# Altium footprint library ref-packages.PCBLIB: 1543 footprints (part 82 of 103) (continued)
## SQFP-S-40X40-512 [mm] (continued)
  rect 1.6x0.17 smd: 129(20.6,-19.05) 130(20.6,-18.75) 131(20.6,-18.45) 132(20.6,-18.15) 133(20.6,-17.85) 134(20.6,-17.55) 135(20.6,-17.25) 136(20.6,-16.95) 137(20.6,-16.65) 138(20.6,-16.35) 139(20.6,-16.05) 140(20.6,-15.75) 141(20.6,-15.45) 142(20.6,-15.15) 143(20.6,-14.85) 144(20.6,-14.55) 145(20.6,-14.25) 146(20.6,-13.95) 147(20.6,-13.65) 148(20.6,-13.35) 149(20.6,-13.05) 150(20.6,-12.75) 151(20.6,-12.45) 152(20.6,-12.15) 153(20.6,-11.85) 154(20.6,-11.55) 155(20.6,-11.25) 156(20.6,-10.95) 157(20.6,-10.65) 158(20.6,-10.35) 159(20.6,-10.05) 160(20.6,-9.75) 161(20.6,-9.45) 162(20.6,-9.15) 163(20.6,-8.85) 164(20.6,-8.55) 165(20.6,-8.25) 166(20.6,-7.95) 167(20.6,-7.65) 168(20.6,-7.35) 169(20.6,-7.05) 170(20.6,-6.75) 171(20.6,-6.45) 172(20.6,-6.15) 173(20.6,-5.85) 174(20.6,-5.55) 175(20.6,-5.25) 176(20.6,-4.95) 177(20.6,-4.65) 178(20.6,-4.35) 179(20.6,-4.05) 180(20.6,-3.75) 181(20.6,-3.45) 182(20.6,-3.15) 183(20.6,-2.85) 184(20.6,-2.55) 185(20.6,-2.25) 186(20.6,-1.95) 187(20.6,-1.65) 188(20.6,-1.35) 189(20.6,-1.05) 190(20.6,-0.75) 191(20.6,-0.45) 192(20.6,-0.15) 193(20.6,0.15) 194(20.6,0.45) 195(20.6,0.75) 196(20.6,1.05) 197(20.6,1.35) 198(20.6,1.65) 199(20.6,1.95) 200(20.6,2.25) 201(20.6,2.55) 202(20.6,2.85) 203(20.6,3.15) 204(20.6,3.45) 205(20.6,3.75) 206(20.6,4.05) 207(20.6,4.35) 208(20.6,4.65) 209(20.6,4.95) 210(20.6,5.25) 211(20.6,5.55) 212(20.6,5.85) 213(20.6,6.15) 214(20.6,6.45) 215(20.6,6.75) 216(20.6,7.05) 217(20.6,7.35) 218(20.6,7.65) 219(20.6,7.95) 220(20.6,8.25) 221(20.6,8.55) 222(20.6,8.85) 223(20.6,9.15) 224(20.6,9.45) 225(20.6,9.75) 226(20.6,10.05) 227(20.6,10.35) 228(20.6,10.65) 229(20.6,10.95) 230(20.6,11.25) 231(20.6,11.55) 232(20.6,11.85) 233(20.6,12.15) 234(20.6,12.45) 235(20.6,12.75) 236(20.6,13.05) 237(20.6,13.35) 238(20.6,13.65) 239(20.6,13.95) 240(20.6,14.25) 241(20.6,14.55) 242(20.6,14.85) 243(20.6,15.15) 244(20.6,15.45) 245(20.6,15.75) 246(20.6,16.05) 247(20.6,16.35) 248(20.6,16.65) 249(20.6,16.95) 250(20.6,17.25) 251(20.6,17.55) 252(20.6,17.85) 253(20.6,18.15) 254(20.6,18.45) 255(20.6,18.75) 256(20.6,19.05) 385(-20.6,19.05) 386(-20.6,18.75) 387(-20.6,18.45) 388(-20.6,18.15) 389(-20.6,17.85) 390(-20.6,17.55) 391(-20.6,17.25) 392(-20.6,16.95) 393(-20.6,16.65) 394(-20.6,16.35) 395(-20.6,16.05) 396(-20.6,15.75) 397(-20.6,15.45) 398(-20.6,15.15) 399(-20.6,14.85) 400(-20.6,14.55) 401(-20.6,14.25) 402(-20.6,13.95) 403(-20.6,13.65) 404(-20.6,13.35) 405(-20.6,13.05) 406(-20.6,12.75) 407(-20.6,12.45) 408(-20.6,12.15) 409(-20.6,11.85) 410(-20.6,11.55) 411(-20.6,11.25) 412(-20.6,10.95) 413(-20.6,10.65) 414(-20.6,10.35) 415(-20.6,10.05) 416(-20.6,9.75) 417(-20.6,9.45) 418(-20.6,9.15) 419(-20.6,8.85) 420(-20.6,8.55) 421(-20.6,8.25) 422(-20.6,7.95) 423(-20.6,7.65) 424(-20.6,7.35) 425(-20.6,7.05) 426(-20.6,6.75) 427(-20.6,6.45) 428(-20.6,6.15) 429(-20.6,5.85) 430(-20.6,5.55) 431(-20.6,5.25) 432(-20.6,4.95) 433(-20.6,4.65) 434(-20.6,4.35) 435(-20.6,4.05) 436(-20.6,3.75) 437(-20.6,3.45) 438(-20.6,3.15) 439(-20.6,2.85) 440(-20.6,2.55) 441(-20.6,2.25) 442(-20.6,1.95) 443(-20.6,1.65) 444(-20.6,1.35) 445(-20.6,1.05) 446(-20.6,0.75) 447(-20.6,0.45) 448(-20.6,0.15) 449(-20.6,-0.15) 450(-20.6,-0.45) 451(-20.6,-0.75) 452(-20.6,-1.05) 453(-20.6,-1.35) 454(-20.6,-1.65) 455(-20.6,-1.95) 456(-20.6,-2.25) 457(-20.6,-2.55) 458(-20.6,-2.85) 459(-20.6,-3.15) 460(-20.6,-3.45) 461(-20.6,-3.75) 462(-20.6,-4.05) 463(-20.6,-4.35) 464(-20.6,-4.65) 465(-20.6,-4.95) 466(-20.6,-5.25) 467(-20.6,-5.55) 468(-20.6,-5.85) 469(-20.6,-6.15) 470(-20.6,-6.45) 471(-20.6,-6.75) 472(-20.6,-7.05) 473(-20.6,-7.35) 474(-20.6,-7.65) 475(-20.6,-7.95) 476(-20.6,-8.25) 477(-20.6,-8.55) 478(-20.6,-8.85) 479(-20.6,-9.15) 480(-20.6,-9.45) 481(-20.6,-9.75) 482(-20.6,-10.05) 483(-20.6,-10.35) 484(-20.6,-10.65) 485(-20.6,-10.95) 486(-20.6,-11.25) 487(-20.6,-11.55) 488(-20.6,-11.85) 489(-20.6,-12.15) 490(-20.6,-12.45) 491(-20.6,-12.75) 492(-20.6,-13.05) 493(-20.6,-13.35) 494(-20.6,-13.65) 495(-20.6,-13.95) 496(-20.6,-14.25) 497(-20.6,-14.55) 498(-20.6,-14.85) 499(-20.6,-15.15) 500(-20.6,-15.45) 501(-20.6,-15.75) 502(-20.6,-16.05) 503(-20.6,-16.35) 504(-20.6,-16.65) 505(-20.6,-16.95) 506(-20.6,-17.25) 507(-20.6,-17.55) 508(-20.6,-17.85) 509(-20.6,-18.15) 510(-20.6,-18.45) 511(-20.6,-18.75) 512(-20.6,-19.05)
Top Overlay:
  circle w0.254: c-18.2,-18.2 r0.75
  lines w0.203: -19.77,-19.76 19.76,-19.76 19.76,19.76 -19.77,19.76 -19.77,-19.76
Mechanical 16:
  drawing of 516 lines, arcs and shapes, not listed
Mechanical 27:
  lines w0.2: -21.9,-21.9 -21.9,21.9 21.9,21.9 21.9,-21.9 -21.9,-21.9

## SQFP-S-40X40-520 [mm]
pads (520):
  rect 0.17x1.6 smd: 1(-19.35,-20.6) 2(-19.05,-20.6) 3(-18.75,-20.6) 4(-18.45,-20.6) 5(-18.15,-20.6) 6(-17.85,-20.6) 7(-17.55,-20.6) 8(-17.25,-20.6) 9(-16.95,-20.6) 10(-16.65,-20.6) 11(-16.35,-20.6) 12(-16.05,-20.6) 13(-15.75,-20.6) 14(-15.45,-20.6) 15(-15.15,-20.6) 16(-14.85,-20.6) 17(-14.55,-20.6) 18(-14.25,-20.6) 19(-13.95,-20.6) 20(-13.65,-20.6) 21(-13.35,-20.6) 22(-13.05,-20.6) 23(-12.75,-20.6) 24(-12.45,-20.6) 25(-12.15,-20.6) 26(-11.85,-20.6) 27(-11.55,-20.6) 28(-11.25,-20.6) 29(-10.95,-20.6) 30(-10.65,-20.6) 31(-10.35,-20.6) 32(-10.05,-20.6) 33(-9.75,-20.6) 34(-9.45,-20.6) 35(-9.15,-20.6) 36(-8.85,-20.6) 37(-8.55,-20.6) 38(-8.25,-20.6) 39(-7.95,-20.6) 40(-7.65,-20.6) 41(-7.35,-20.6) 42(-7.05,-20.6) 43(-6.75,-20.6) 44(-6.45,-20.6) 45(-6.15,-20.6) 46(-5.85,-20.6) 47(-5.55,-20.6) 48(-5.25,-20.6) 49(-4.95,-20.6) 50(-4.65,-20.6) 51(-4.35,-20.6) 52(-4.05,-20.6) 53(-3.75,-20.6) 54(-3.45,-20.6) 55(-3.15,-20.6) 56(-2.85,-20.6) 57(-2.55,-20.6) 58(-2.25,-20.6) 59(-1.95,-20.6) 60(-1.65,-20.6) 61(-1.35,-20.6) 62(-1.05,-20.6) 63(-0.75,-20.6) 64(-0.45,-20.6) 65(-0.15,-20.6) 66(0.15,-20.6) 67(0.45,-20.6) 68(0.75,-20.6) 69(1.05,-20.6) 70(1.35,-20.6) 71(1.65,-20.6) 72(1.95,-20.6) 73(2.25,-20.6) 74(2.55,-20.6) 75(2.85,-20.6) 76(3.15,-20.6) 77(3.45,-20.6) 78(3.75,-20.6) 79(4.05,-20.6) 80(4.35,-20.6) 81(4.65,-20.6) 82(4.95,-20.6) 83(5.25,-20.6) 84(5.55,-20.6) 85(5.85,-20.6) 86(6.15,-20.6) 87(6.45,-20.6) 88(6.75,-20.6) 89(7.05,-20.6) 90(7.35,-20.6) 91(7.65,-20.6) 92(7.95,-20.6) 93(8.25,-20.6) 94(8.55,-20.6) 95(8.85,-20.6) 96(9.15,-20.6) 97(9.45,-20.6) 98(9.75,-20.6) 99(10.05,-20.6) 100(10.35,-20.6) 101(10.65,-20.6) 102(10.95,-20.6) 103(11.25,-20.6) 104(11.55,-20.6) 105(11.85,-20.6) 106(12.15,-20.6) 107(12.45,-20.6) 108(12.75,-20.6) 109(13.05,-20.6) 110(13.35,-20.6) 111(13.65,-20.6) 112(13.95,-20.6) 113(14.25,-20.6) 114(14.55,-20.6) 115(14.85,-20.6) 116(15.15,-20.6) 117(15.45,-20.6) 118(15.75,-20.6) 119(16.05,-20.6) 120(16.35,-20.6) 121(16.65,-20.6) 122(16.95,-20.6) 123(17.25,-20.6) 124(17.55,-20.6) 125(17.85,-20.6) 126(18.15,-20.6) 127(18.45,-20.6) 128(18.75,-20.6) 129(19.05,-20.6) 130(19.35,-20.6) 261(19.35,20.6) 262(19.05,20.6) 263(18.75,20.6) 264(18.45,20.6) 265(18.15,20.6) 266(17.85,20.6) 267(17.55,20.6) 268(17.25,20.6) 269(16.95,20.6) 270(16.65,20.6) 271(16.35,20.6) 272(16.05,20.6) 273(15.75,20.6) 274(15.45,20.6) 275(15.15,20.6) 276(14.85,20.6) 277(14.55,20.6) 278(14.25,20.6) 279(13.95,20.6) 280(13.65,20.6) 281(13.35,20.6) 282(13.05,20.6) 283(12.75,20.6) 284(12.45,20.6) 285(12.15,20.6) 286(11.85,20.6) 287(11.55,20.6) 288(11.25,20.6) 289(10.95,20.6) 290(10.65,20.6) 291(10.35,20.6) 292(10.05,20.6) 293(9.75,20.6) 294(9.45,20.6) 295(9.15,20.6) 296(8.85,20.6) 297(8.55,20.6) 298(8.25,20.6) 299(7.95,20.6) 300(7.65,20.6) 301(7.35,20.6) 302(7.05,20.6) 303(6.75,20.6) 304(6.45,20.6) 305(6.15,20.6) 306(5.85,20.6) 307(5.55,20.6) 308(5.25,20.6) 309(4.95,20.6) 310(4.65,20.6) 311(4.35,20.6) 312(4.05,20.6) 313(3.75,20.6) 314(3.45,20.6) 315(3.15,20.6) 316(2.85,20.6) 317(2.55,20.6) 318(2.25,20.6) 319(1.95,20.6) 320(1.65,20.6) 321(1.35,20.6) 322(1.05,20.6) 323(0.75,20.6) 324(0.45,20.6) 325(0.15,20.6) 326(-0.15,20.6) 327(-0.45,20.6) 328(-0.75,20.6) 329(-1.05,20.6) 330(-1.35,20.6) 331(-1.65,20.6) 332(-1.95,20.6) 333(-2.25,20.6) 334(-2.55,20.6) 335(-2.85,20.6) 336(-3.15,20.6) 337(-3.45,20.6) 338(-3.75,20.6) 339(-4.05,20.6) 340(-4.35,20.6) 341(-4.65,20.6) 342(-4.95,20.6) 343(-5.25,20.6) 344(-5.55,20.6) 345(-5.85,20.6) 346(-6.15,20.6) 347(-6.45,20.6) 348(-6.75,20.6) 349(-7.05,20.6) 350(-7.35,20.6) 351(-7.65,20.6) 352(-7.95,20.6) 353(-8.25,20.6) 354(-8.55,20.6) 355(-8.85,20.6) 356(-9.15,20.6) 357(-9.45,20.6) 358(-9.75,20.6) 359(-10.05,20.6) 360(-10.35,20.6) 361(-10.65,20.6) 362(-10.95,20.6) 363(-11.25,20.6) 364(-11.55,20.6) 365(-11.85,20.6) 366(-12.15,20.6) 367(-12.45,20.6) 368(-12.75,20.6) 369(-13.05,20.6) 370(-13.35,20.6) 371(-13.65,20.6) 372(-13.95,20.6) 373(-14.25,20.6) 374(-14.55,20.6) 375(-14.85,20.6) 376(-15.15,20.6) 377(-15.45,20.6) 378(-15.75,20.6) 379(-16.05,20.6) 380(-16.35,20.6) 381(-16.65,20.6) 382(-16.95,20.6) 383(-17.25,20.6) 384(-17.55,20.6) 385(-17.85,20.6) 386(-18.15,20.6) 387(-18.45,20.6) 388(-18.75,20.6) 389(-19.05,20.6) 390(-19.35,20.6)
  rect 1.6x0.17 smd: 131(20.6,-19.35) 132(20.6,-19.05) 133(20.6,-18.75) 134(20.6,-18.45) 135(20.6,-18.15) 136(20.6,-17.85) 137(20.6,-17.55) 138(20.6,-17.25) 139(20.6,-16.95) 140(20.6,-16.65) 141(20.6,-16.35) 142(20.6,-16.05) 143(20.6,-15.75) 144(20.6,-15.45) 145(20.6,-15.15) 146(20.6,-14.85) 147(20.6,-14.55) 148(20.6,-14.25) 149(20.6,-13.95) 150(20.6,-13.65) 151(20.6,-13.35) 152(20.6,-13.05) 153(20.6,-12.75) 154(20.6,-12.45) 155(20.6,-12.15) 156(20.6,-11.85) 157(20.6,-11.55) 158(20.6,-11.25) 159(20.6,-10.95) 160(20.6,-10.65) 161(20.6,-10.35) 162(20.6,-10.05) 163(20.6,-9.75) 164(20.6,-9.45) 165(20.6,-9.15) 166(20.6,-8.85) 167(20.6,-8.55) 168(20.6,-8.25) 169(20.6,-7.95) 170(20.6,-7.65) 171(20.6,-7.35) 172(20.6,-7.05) 173(20.6,-6.75) 174(20.6,-6.45) 175(20.6,-6.15) 176(20.6,-5.85) 177(20.6,-5.55) 178(20.6,-5.25) 179(20.6,-4.95) 180(20.6,-4.65) 181(20.6,-4.35) 182(20.6,-4.05) 183(20.6,-3.75) 184(20.6,-3.45) 185(20.6,-3.15) 186(20.6,-2.85) 187(20.6,-2.55) 188(20.6,-2.25) 189(20.6,-1.95) 190(20.6,-1.65) 191(20.6,-1.35) 192(20.6,-1.05) 193(20.6,-0.75) 194(20.6,-0.45) 195(20.6,-0.15) 196(20.6,0.15) 197(20.6,0.45) 198(20.6,0.75) 199(20.6,1.05) 200(20.6,1.35) 201(20.6,1.65) 202(20.6,1.95) 203(20.6,2.25) 204(20.6,2.55) 205(20.6,2.85) 206(20.6,3.15) 207(20.6,3.45) 208(20.6,3.75) 209(20.6,4.05) 210(20.6,4.35) 211(20.6,4.65) 212(20.6,4.95) 213(20.6,5.25) 214(20.6,5.55) 215(20.6,5.85) 216(20.6,6.15) 217(20.6,6.45) 218(20.6,6.75) 219(20.6,7.05) 220(20.6,7.35) 221(20.6,7.65) 222(20.6,7.95) 223(20.6,8.25) 224(20.6,8.55) 225(20.6,8.85) 226(20.6,9.15) 227(20.6,9.45) 228(20.6,9.75) 229(20.6,10.05) 230(20.6,10.35) 231(20.6,10.65) 232(20.6,10.95) 233(20.6,11.25) 234(20.6,11.55) 235(20.6,11.85) 236(20.6,12.15) 237(20.6,12.45) 238(20.6,12.75) 239(20.6,13.05) 240(20.6,13.35) 241(20.6,13.65) 242(20.6,13.95) 243(20.6,14.25) 244(20.6,14.55) 245(20.6,14.85) 246(20.6,15.15) 247(20.6,15.45) 248(20.6,15.75) 249(20.6,16.05) 250(20.6,16.35) 251(20.6,16.65) 252(20.6,16.95) 253(20.6,17.25) 254(20.6,17.55) 255(20.6,17.85) 256(20.6,18.15) 257(20.6,18.45) 258(20.6,18.75) 259(20.6,19.05) 260(20.6,19.35) 391(-20.6,19.35) 392(-20.6,19.05) 393(-20.6,18.75) 394(-20.6,18.45) 395(-20.6,18.15) 396(-20.6,17.85) 397(-20.6,17.55) 398(-20.6,17.25) 399(-20.6,16.95) 400(-20.6,16.65) 401(-20.6,16.35) 402(-20.6,16.05) 403(-20.6,15.75) 404(-20.6,15.45) 405(-20.6,15.15) 406(-20.6,14.85) 407(-20.6,14.55) 408(-20.6,14.25) 409(-20.6,13.95) 410(-20.6,13.65) 411(-20.6,13.35) 412(-20.6,13.05) 413(-20.6,12.75) 414(-20.6,12.45) 415(-20.6,12.15) 416(-20.6,11.85) 417(-20.6,11.55) 418(-20.6,11.25) 419(-20.6,10.95) 420(-20.6,10.65) 421(-20.6,10.35) 422(-20.6,10.05) 423(-20.6,9.75) 424(-20.6,9.45) 425(-20.6,9.15) 426(-20.6,8.85) 427(-20.6,8.55) 428(-20.6,8.25) 429(-20.6,7.95) 430(-20.6,7.65) 431(-20.6,7.35) 432(-20.6,7.05) 433(-20.6,6.75) 434(-20.6,6.45) 435(-20.6,6.15) 436(-20.6,5.85) 437(-20.6,5.55) 438(-20.6,5.25) 439(-20.6,4.95) 440(-20.6,4.65) 441(-20.6,4.35) 442(-20.6,4.05) 443(-20.6,3.75) 444(-20.6,3.45) 445(-20.6,3.15) 446(-20.6,2.85) 447(-20.6,2.55) 448(-20.6,2.25) 449(-20.6,1.95) 450(-20.6,1.65) 451(-20.6,1.35) 452(-20.6,1.05) 453(-20.6,0.75) 454(-20.6,0.45) 455(-20.6,0.15) 456(-20.6,-0.15) 457(-20.6,-0.45) 458(-20.6,-0.75) 459(-20.6,-1.05) 460(-20.6,-1.35) 461(-20.6,-1.65) 462(-20.6,-1.95) 463(-20.6,-2.25) 464(-20.6,-2.55) 465(-20.6,-2.85) 466(-20.6,-3.15) 467(-20.6,-3.45) 468(-20.6,-3.75) 469(-20.6,-4.05) 470(-20.6,-4.35) 471(-20.6,-4.65) 472(-20.6,-4.95) 473(-20.6,-5.25) 474(-20.6,-5.55) 475(-20.6,-5.85) 476(-20.6,-6.15) 477(-20.6,-6.45) 478(-20.6,-6.75) 479(-20.6,-7.05) 480(-20.6,-7.35) 481(-20.6,-7.65) 482(-20.6,-7.95) 483(-20.6,-8.25) 484(-20.6,-8.55) 485(-20.6,-8.85) 486(-20.6,-9.15) 487(-20.6,-9.45) 488(-20.6,-9.75) 489(-20.6,-10.05) 490(-20.6,-10.35) 491(-20.6,-10.65) 492(-20.6,-10.95) 493(-20.6,-11.25) 494(-20.6,-11.55) 495(-20.6,-11.85) 496(-20.6,-12.15) 497(-20.6,-12.45) 498(-20.6,-12.75) 499(-20.6,-13.05) 500(-20.6,-13.35) 501(-20.6,-13.65) 502(-20.6,-13.95) 503(-20.6,-14.25) 504(-20.6,-14.55) 505(-20.6,-14.85) 506(-20.6,-15.15) 507(-20.6,-15.45) 508(-20.6,-15.75) 509(-20.6,-16.05) 510(-20.6,-16.35) 511(-20.6,-16.65) 512(-20.6,-16.95) 513(-20.6,-17.25) 514(-20.6,-17.55) 515(-20.6,-17.85) 516(-20.6,-18.15) 517(-20.6,-18.45) 518(-20.6,-18.75) 519(-20.6,-19.05) 520(-20.6,-19.35)
Top Overlay:
  circle w0.254: c-18.2,-18.2 r0.75
  lines w0.203: -19.77,-19.76 19.76,-19.76 19.76,19.76 -19.77,19.76 -19.77,-19.76
Mechanical 16:
  drawing of 524 lines, arcs and shapes, not listed
Mechanical 27:
  lines w0.2: -21.9,-21.9 -21.9,21.9 21.9,21.9 21.9,-21.9 -21.9,-21.9

## SQFP-S-44X44-336 [mil]
pads (336):
  rect 11.81x62.99 smd: 1(-816.93,-889.76) 2(-797.24,-889.76) 3(-777.56,-889.76) 4(-757.87,-889.76) 5(-738.19,-889.76) 6(-718.5,-889.76) 7(-698.82,-889.76) 8(-679.13,-889.76) 9(-659.45,-889.76) 10(-639.76,-889.76) 11(-620.08,-889.76) 12(-600.39,-889.76) 13(-580.71,-889.76) 14(-561.02,-889.76) 15(-541.34,-889.76) 16(-521.65,-889.76) 17(-501.97,-889.76) 18(-482.28,-889.76) 19(-462.6,-889.76) 20(-442.91,-889.76) 21(-423.23,-889.76) 22(-403.54,-889.76) 23(-383.86,-889.76) 24(-364.17,-889.76) 25(-344.49,-889.76) 26(-324.8,-889.76) 27(-305.12,-889.76) 28(-285.43,-889.76) 29(-265.75,-889.76) 30(-246.06,-889.76) 31(-226.38,-889.76) 32(-206.69,-889.76) 33(-187.01,-889.76) 34(-167.32,-889.76) 35(-147.64,-889.76) 36(-127.95,-889.76) 37(-108.27,-889.76) 38(-88.58,-889.76) 39(-68.9,-889.76) 40(-49.21,-889.76) 41(-29.53,-889.76) 42(-9.84,-889.76) 43(9.84,-889.76) 44(29.53,-889.76) 45(49.21,-889.76) 46(68.9,-889.76) 47(88.58,-889.76) 48(108.27,-889.76) 49(127.95,-889.76) 50(147.64,-889.76) 51(167.32,-889.76) 52(187.01,-889.76) 53(206.69,-889.76) 54(226.38,-889.76) 55(246.06,-889.76) 56(265.75,-889.76) 57(285.43,-889.76) 58(305.12,-889.76) 59(324.8,-889.76) 60(344.49,-889.76) 61(364.17,-889.76) 62(383.86,-889.76) 63(403.54,-889.76) 64(423.23,-889.76) 65(442.91,-889.76) 66(462.6,-889.76) 67(482.28,-889.76) 68(501.97,-889.76) 69(521.65,-889.76) 70(541.34,-889.76) 71(561.02,-889.76) 72(580.71,-889.76) 73(600.39,-889.76) 74(620.08,-889.76) 75(639.76,-889.76) 76(659.45,-889.76) 77(679.13,-889.76) 78(698.82,-889.76) 79(718.5,-889.76) 80(738.19,-889.76) 81(757.87,-889.76) 82(777.56,-889.76) 83(797.24,-889.76) 84(816.93,-889.76) 169(816.93,889.76) 170(797.24,889.76) 171(777.56,889.76) 172(757.87,889.76) 173(738.19,889.76) 174(718.5,889.76) 175(698.82,889.76) 176(679.13,889.76) 177(659.45,889.76) 178(639.76,889.76) 179(620.08,889.76) 180(600.39,889.76) 181(580.71,889.76) 182(561.02,889.76) 183(541.34,889.76) 184(521.65,889.76) 185(501.97,889.76) 186(482.28,889.76) 187(462.6,889.76) 188(442.91,889.76) 189(423.23,889.76) 190(403.54,889.76) 191(383.86,889.76) 192(364.17,889.76) 193(344.49,889.76) 194(324.8,889.76) 195(305.12,889.76) 196(285.43,889.76) 197(265.75,889.76) 198(246.06,889.76) 199(226.38,889.76) 200(206.69,889.76) 201(187.01,889.76) 202(167.32,889.76) 203(147.64,889.76) 204(127.95,889.76) 205(108.27,889.76) 206(88.58,889.76) 207(68.9,889.76) 208(49.21,889.76) 209(29.53,889.76) 210(9.84,889.76) 211(-9.84,889.76) 212(-29.53,889.76) 213(-49.21,889.76) 214(-68.9,889.76) 215(-88.58,889.76) 216(-108.27,889.76) 217(-127.95,889.76) 218(-147.64,889.76) 219(-167.32,889.76) 220(-187.01,889.76) 221(-206.69,889.76) 222(-226.38,889.76) 223(-246.06,889.76) 224(-265.75,889.76) 225(-285.43,889.76) 226(-305.12,889.76) 227(-324.8,889.76) 228(-344.49,889.76) 229(-364.17,889.76) 230(-383.86,889.76) 231(-403.54,889.76) 232(-423.23,889.76) 233(-442.91,889.76) 234(-462.6,889.76) 235(-482.28,889.76) 236(-501.97,889.76) 237(-521.65,889.76) 238(-541.34,889.76) 239(-561.02,889.76) 240(-580.71,889.76) 241(-600.39,889.76) 242(-620.08,889.76) 243(-639.76,889.76) 244(-659.45,889.76) 245(-679.13,889.76) 246(-698.82,889.76) 247(-718.5,889.76) 248(-738.19,889.76) 249(-757.87,889.76) 250(-777.56,889.76) 251(-797.24,889.76) 252(-816.93,889.76)
  rect 62.99x11.81 smd: 85(889.76,-816.93) 86(889.76,-797.24) 87(889.76,-777.56) 88(889.76,-757.87) 89(889.76,-738.19) 90(889.76,-718.5) 91(889.76,-698.82) 92(889.76,-679.13) 93(889.76,-659.45) 94(889.76,-639.76) 95(889.76,-620.08) 96(889.76,-600.39) 97(889.76,-580.71) 98(889.76,-561.02) 99(889.76,-541.34) 100(889.76,-521.65) 101(889.76,-501.97) 102(889.76,-482.28) 103(889.76,-462.6) 104(889.76,-442.91) 105(889.76,-423.23) 106(889.76,-403.54) 107(889.76,-383.86) 108(889.76,-364.17) 109(889.76,-344.49) 110(889.76,-324.8) 111(889.76,-305.12) 112(889.76,-285.43) 113(889.76,-265.75) 114(889.76,-246.06) 115(889.76,-226.38) 116(889.76,-206.69) 117(889.76,-187.01) 118(889.76,-167.32) 119(889.76,-147.64) 120(889.76,-127.95) 121(889.76,-108.27) 122(889.76,-88.58) 123(889.76,-68.9) 124(889.76,-49.21) 125(889.76,-29.53) 126(889.76,-9.84) 127(889.76,9.84) 128(889.76,29.53) 129(889.76,49.21) 130(889.76,68.9) 131(889.76,88.58) 132(889.76,108.27) 133(889.76,127.95) 134(889.76,147.64) 135(889.76,167.32) 136(889.76,187.01) 137(889.76,206.69) 138(889.76,226.38) 139(889.76,246.06) 140(889.76,265.75) 141(889.76,285.43) 142(889.76,305.12) 143(889.76,324.8) 144(889.76,344.49) 145(889.76,364.17) 146(889.76,383.86) 147(889.76,403.54) 148(889.76,423.23) 149(889.76,442.91) 150(889.76,462.6) 151(889.76,482.28) 152(889.76,501.97) 153(889.76,521.65) 154(889.76,541.34) 155(889.76,561.02) 156(889.76,580.71) 157(889.76,600.39) 158(889.76,620.08) 159(889.76,639.76) 160(889.76,659.45) 161(889.76,679.13) 162(889.76,698.82) 163(889.76,718.5) 164(889.76,738.19) 165(889.76,757.87) 166(889.76,777.56) 167(889.76,797.24) 168(889.76,816.93) 253(-889.76,816.93) 254(-889.76,797.24) 255(-889.76,777.56) 256(-889.76,757.87) 257(-889.76,738.19) 258(-889.76,718.5) 259(-889.76,698.82) 260(-889.76,679.13) 261(-889.76,659.45) 262(-889.76,639.76) 263(-889.76,620.08) 264(-889.76,600.39) 265(-889.76,580.71) 266(-889.76,561.02) 267(-889.76,541.34) 268(-889.76,521.65) 269(-889.76,501.97) 270(-889.76,482.28) 271(-889.76,462.6) 272(-889.76,442.91) 273(-889.76,423.23) 274(-889.76,403.54) 275(-889.76,383.86) 276(-889.76,364.17) 277(-889.76,344.49) 278(-889.76,324.8) 279(-889.76,305.12) 280(-889.76,285.43) 281(-889.76,265.75) 282(-889.76,246.06) 283(-889.76,226.38) 284(-889.76,206.69) 285(-889.76,187.01) 286(-889.76,167.32) 287(-889.76,147.64) 288(-889.76,127.95) 289(-889.76,108.27) 290(-889.76,88.58) 291(-889.76,68.9) 292(-889.76,49.21) 293(-889.76,29.53) 294(-889.76,9.84) 295(-889.76,-9.84) 296(-889.76,-29.53) 297(-889.76,-49.21) 298(-889.76,-68.9) 299(-889.76,-88.58) 300(-889.76,-108.27) 301(-889.76,-127.95) 302(-889.76,-147.64) 303(-889.76,-167.32) 304(-889.76,-187.01) 305(-889.76,-206.69) 306(-889.76,-226.38) 307(-889.76,-246.06) 308(-889.76,-265.75) 309(-889.76,-285.43) 310(-889.76,-305.12) 311(-889.76,-324.8) 312(-889.76,-344.49) 313(-889.76,-364.17) 314(-889.76,-383.86) 315(-889.76,-403.54) 316(-889.76,-423.23) 317(-889.76,-442.91) 318(-889.76,-462.6) 319(-889.76,-482.28) 320(-889.76,-501.97) 321(-889.76,-521.65) 322(-889.76,-541.34) 323(-889.76,-561.02) 324(-889.76,-580.71) 325(-889.76,-600.39) 326(-889.76,-620.08) 327(-889.76,-639.76) 328(-889.76,-659.45) 329(-889.76,-679.13) 330(-889.76,-698.82) 331(-889.76,-718.5) 332(-889.76,-738.19) 333(-889.76,-757.87) 334(-889.76,-777.56) 335(-889.76,-797.24) 336(-889.76,-816.93)
Top Overlay:
  circle w10: c-775.59,-795.28 r29.53
  lines w8: -857.09,-856.69 856.69,-856.69 856.69,856.69 -857.09,856.69 -857.09,-856.69
Mechanical 16:
  drawing of 340 lines, arcs and shapes, not listed
Mechanical 27:
  lines w7.87: -960.63,-960.63 -960.63,960.63 960.63,960.63 960.63,-960.63 -960.63,-960.63